# Altium footprint library texas.PCBLIB: 124 footprints (part 1 of 12)
Each footprint in its own frame and in the unit in brackets; x right, y up, seen from the top. Pads: shape width x height; smd on the part's side, far side on the other; paste and mask are expansions set on the pad; w line width, h text height; cw(c..) or ccw(c..) is an arc to the next point about the centre after c.
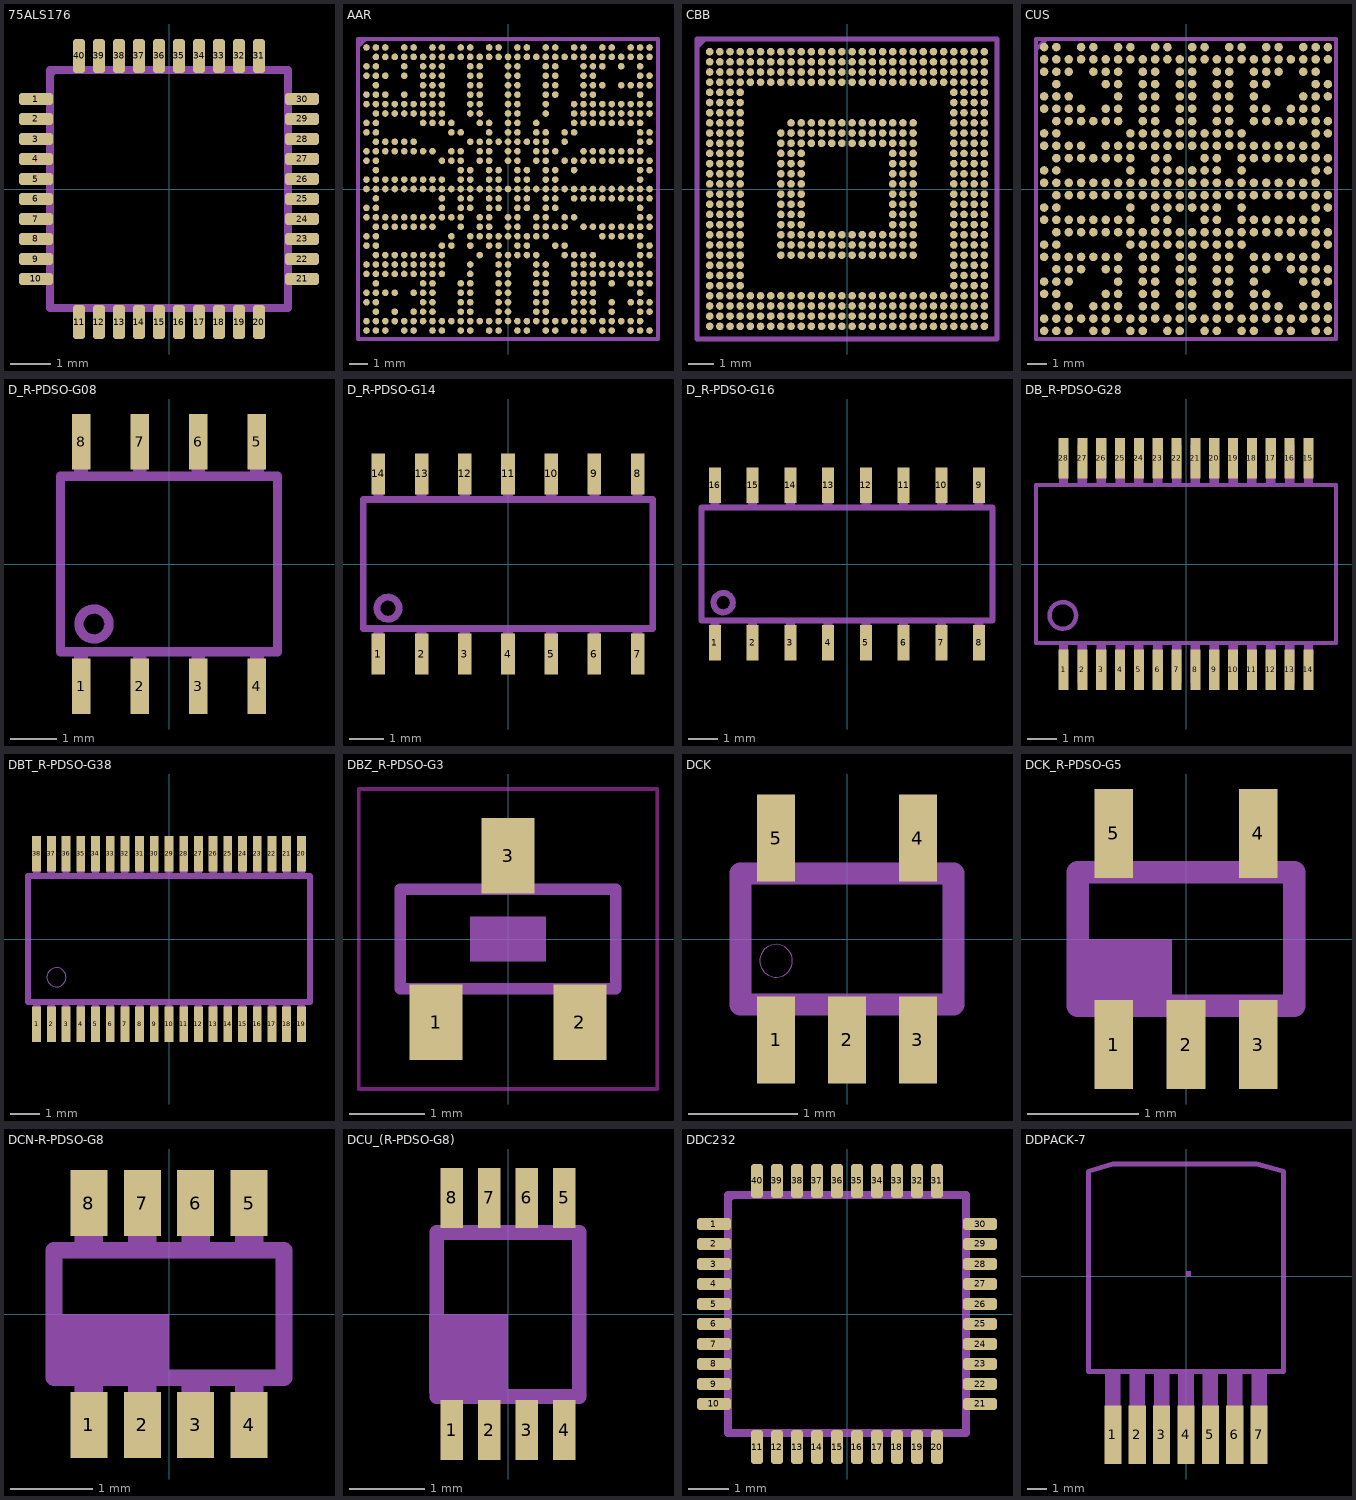
[diagram p0: the footprints below, top view; thin cyan lines are the x and y axes]

## 75ALS176 [mm]
pads (40):
  rrect50% 0.85x0.3 smd: 1(-3.325,2.25) 2(-3.325,1.75) 3(-3.325,1.25) 4(-3.325,0.75) 5(-3.325,0.25) 6(-3.325,-0.25) 7(-3.325,-0.75) 8(-3.325,-1.25) 9(-3.325,-1.75) 10(-3.325,-2.25) 21(3.325,-2.25) 22(3.325,-1.75) 23(3.325,-1.25) 24(3.325,-0.75) 25(3.325,-0.25) 26(3.325,0.25) 27(3.325,0.75) 28(3.325,1.25) 29(3.325,1.75) 30(3.325,2.25)
  rrect50% 0.3x0.85 smd: 11(-2.25,-3.325) 12(-1.75,-3.325) 13(-1.25,-3.325) 14(-0.75,-3.325) 15(-0.25,-3.325) 16(0.25,-3.325) 17(0.75,-3.325) 18(1.25,-3.325) 19(1.75,-3.325) 20(2.25,-3.325) 31(2.25,3.325) 32(1.75,3.325) 33(1.25,3.325) 34(0.75,3.325) 35(0.25,3.325) 36(-0.25,3.325) 37(-0.75,3.325) 38(-1.25,3.325) 39(-1.75,3.325) 40(-2.25,3.325)
Mechanical 2:
  lines w0.203: -2.973,2.875 -2.875,2.973 ; -2.973,-2.973 2.973,-2.973 2.973,2.973 -2.973,2.973 -2.973,-2.973
Mechanical 18:
  rectangle: -3.4,2.135 -3.075,2.365
  rectangle: -3.4,1.635 -3.075,1.865
  rectangle: -3.4,1.135 -3.075,1.365
  rectangle: -3.4,0.635 -3.075,0.865
  rectangle: -3.4,0.135 -3.075,0.365
  rectangle: -3.4,-0.365 -3.075,-0.135
  rectangle: -3.4,-0.865 -3.075,-0.635
  rectangle: -3.4,-1.365 -3.075,-1.135
  rectangle: -3.4,-1.865 -3.075,-1.635
  rectangle: -3.4,-2.365 -3.075,-2.135
  rectangle: -2.365,-3.4 -2.135,-3.075
  rectangle: -1.865,-3.4 -1.635,-3.075
  rectangle: -1.365,-3.4 -1.135,-3.075
  rectangle: -0.865,-3.4 -0.635,-3.075
  rectangle: -0.365,-3.4 -0.135,-3.075
  rectangle: 0.135,-3.4 0.365,-3.075
  rectangle: 0.635,-3.4 0.865,-3.075
  rectangle: 1.135,-3.4 1.365,-3.075
  rectangle: 1.635,-3.4 1.865,-3.075
  rectangle: 2.135,-3.4 2.365,-3.075
  rectangle: 3.075,-2.365 3.4,-2.135
  rectangle: 3.075,-1.865 3.4,-1.635
  rectangle: 3.075,-1.365 3.4,-1.135
  rectangle: 3.075,-0.865 3.4,-0.635
  rectangle: 3.075,-0.365 3.4,-0.135
  rectangle: 3.075,0.135 3.4,0.365
  rectangle: 3.075,0.635 3.4,0.865
  rectangle: 3.075,1.135 3.4,1.365
  rectangle: 3.075,1.635 3.4,1.865
  rectangle: 3.075,2.135 3.4,2.365
  rectangle: 2.135,3.075 2.365,3.4
  rectangle: 1.635,3.075 1.865,3.4
  rectangle: 1.135,3.075 1.365,3.4
  rectangle: 0.635,3.075 0.865,3.4
  rectangle: 0.135,3.075 0.365,3.4
  rectangle: -0.365,3.075 -0.135,3.4
  rectangle: -0.865,3.075 -0.635,3.4
  rectangle: -1.365,3.075 -1.135,3.4
  rectangle: -1.865,3.075 -1.635,3.4
  rectangle: -2.365,3.075 -2.135,3.4

## AAR [mm]
pads (609):
  rrect100% 0.35x0.35 smd mask-0.175: A1(-7.5,7.5) A2(-7,7.5) A3(-6.5,7.5) A5(-5.5,7.5) A6(-5,7.5) A8(-4,7.5) A9(-3.5,7.5) A11(-2.5,7.5) A12(-2,7.5) A14(-1,7.5) A15(-0.5,7.5) A17(0.5,7.5) A18(1,7.5) A20(2,7.5) A21(2.5,7.5) A23(3.5,7.5) A24(4,7.5) A26(5,7.5) A27(5.5,7.5) A29(6.5,7.5) A30(7,7.5) A31(7.5,7.5) AA1(-7.5,-2.5) AA2(-7,-2.5) AA10(-3,-2.5) AA12(-2,-2.5) AA13(-1.5,-2.5) AA14(-1,-2.5) AA15(-0.5,-2.5) AA16(0,-2.5) AA17(0.5,-2.5) AA18(1,-2.5) AA19(1.5,-2.5) AA20(2,-2.5) AA26(5,-2.5) AA27(5.5,-2.5) AA28(6,-2.5) AA29(6.5,-2.5) AA30(7,-2.5) AB1(-7.5,-3) AB2(-7,-3) AB9(-3.5,-3) AB10(-3,-3) AB12(-2,-3) AB14(-1,-3) AB15(-0.5,-3) AB17(0.5,-3) AB18(1,-3) AB21(2.5,-3) AB22(3,-3) AB30(7,-3) AB31(7.5,-3) AC2(-7,-3.5) AC3(-6.5,-3.5) AC4(-6,-3.5) AC5(-5.5,-3.5) AC6(-5,-3.5) AC7(-4.5,-3.5) AC8(-4,-3.5) AC9(-3.5,-3.5) AC13(-1.5,-3.5) AC15(-0.5,-3.5) AC16(0,-3.5) AC17(0.5,-3.5) AC18(1,-3.5) AC19(1.5,-3.5) AC22(3,-3.5) AC23(3.5,-3.5) AC24(4,-3.5) AC25(4.5,-3.5) AC30(7,-3.5) AC31(7.5,-3.5) AD1(-7.5,-4) AD2(-7,-4) AD3(-6.5,-4) AD4(-6,-4) AD5(-5.5,-4) AD6(-5,-4) AD7(-4.5,-4) AD8(-4,-4) AD9(-3.5,-4) AD12(-2,-4) AD15(-0.5,-4) AD16(0,-4) AD19(1.5,-4) AD20(2,-4) AD23(3.5,-4) AD24(4,-4) AD25(4.5,-4) AD26(5,-4) AD27(5.5,-4) AD28(6,-4) AD29(6.5,-4) AD30(7,-4) AE1(-7.5,-4.5) AE2(-7,-4.5) AE3(-6.5,-4.5) AE4(-6,-4.5) AE5(-5.5,-4.5) AE6(-5,-4.5) AE7(-4.5,-4.5) AE8(-4,-4.5) AE9(-3.5,-4.5) AE12(-2,-4.5) AE15(-0.5,-4.5) AE16(0,-4.5) AE19(1.5,-4.5) AE20(2,-4.5) AE23(3.5,-4.5) AE24(4,-4.5) AE25(4.5,-4.5) AE26(5,-4.5) AE27(5.5,-4.5) AE28(6,-4.5) AE29(6.5,-4.5) AE30(7,-4.5) AE31(7.5,-4.5) AF2(-7,-5) AF7(-4.5,-5) AF8(-4,-5) AF11(-2.5,-5) AF12(-2,-5) AF15(-0.5,-5) AF16(0,-5) AF19(1.5,-5) AF20(2,-5) AF23(3.5,-5) AF24(4,-5) AF25(4.5,-5) AF27(5.5,-5) AF29(6.5,-5) AF30(7,-5) AF31(7.5,-5) AG1(-7.5,-5.5) AG2(-7,-5.5) AG3(-6.5,-5.5) AG4(-6,-5.5) AG6(-5,-5.5) AG7(-4.5,-5.5) AG8(-4,-5.5) AG11(-2.5,-5.5) AG12(-2,-5.5) AG15(-0.5,-5.5) AG16(0,-5.5) AG19(1.5,-5.5) AG20(2,-5.5) AG23(3.5,-5.5) AG24(4,-5.5) AG25(4.5,-5.5) AG30(7,-5.5) AH1(-7.5,-6) AH2(-7,-6) AH7(-4.5,-6) AH8(-4,-6) AH11(-2.5,-6) AH12(-2,-6) AH15(-0.5,-6) AH16(0,-6) AH19(1.5,-6) AH20(2,-6) AH23(3.5,-6) AH24(4,-6) AH25(4.5,-6) AH27(5.5,-6) AH29(6.5,-6) AH30(7,-6) AH31(7.5,-6) AJ2(-7,-6.5) AJ4(-6,-6.5) AJ6(-5,-6.5) AJ7(-4.5,-6.5) AJ8(-4,-6.5) AJ11(-2.5,-6.5) AJ12(-2,-6.5) AJ15(-0.5,-6.5) AJ16(0,-6.5) AJ19(1.5,-6.5) AJ20(2,-6.5) AJ23(3.5,-6.5) AJ24(4,-6.5) AJ25(4.5,-6.5) AJ27(5.5,-6.5) AJ30(7,-6.5) AJ31(7.5,-6.5) AK1(-7.5,-7) AK2(-7,-7) AK3(-6.5,-7) AK4(-6,-7) AK5(-5.5,-7) AK6(-5,-7) AK7(-4.5,-7) AK8(-4,-7) AK9(-3.5,-7) AK10(-3,-7) AK11(-2.5,-7) AK12(-2,-7) AK13(-1.5,-7) AK14(-1,-7) AK15(-0.5,-7) AK16(0,-7) AK17(0.5,-7) AK18(1,-7) AK19(1.5,-7) AK20(2,-7) AK21(2.5,-7) AK22(3,-7) AK23(3.5,-7) AK24(4,-7) AK25(4.5,-7) AK26(5,-7) AK27(5.5,-7) AK28(6,-7) AK29(6.5,-7) AK30(7,-7) AL1(-7.5,-7.5) AL2(-7,-7.5) AL3(-6.5,-7.5) AL5(-5.5,-7.5) AL6(-5,-7.5) AL8(-4,-7.5) AL9(-3.5,-7.5) AL11(-2.5,-7.5) AL12(-2,-7.5) AL14(-1,-7.5) AL15(-0.5,-7.5) AL17(0.5,-7.5) AL18(1,-7.5) AL20(2,-7.5) AL21(2.5,-7.5) AL23(3.5,-7.5) AL24(4,-7.5) AL26(5,-7.5) AL27(5.5,-7.5) AL29(6.5,-7.5) AL30(7,-7.5) AL31(7.5,-7.5) B2(-7,7) B3(-6.5,7) B4(-6,7) B5(-5.5,7) B6(-5,7) B7(-4.5,7) B8(-4,7) B9(-3.5,7) B10(-3,7) B11(-2.5,7) B12(-2,7) B13(-1.5,7) B14(-1,7) B15(-0.5,7) B16(0,7) B17(0.5,7) B18(1,7) B19(1.5,7) B20(2,7) B21(2.5,7) B22(3,7) B23(3.5,7) B24(4,7) B25(4.5,7) B26(5,7) B27(5.5,7) B28(6,7) B29(6.5,7) B30(7,7) B31(7.5,7) C1(-7.5,6.5) C2(-7,6.5) C5(-5.5,6.5) C7(-4.5,6.5) C8(-4,6.5) C9(-3.5,6.5) C12(-2,6.5) C13(-1.5,6.5) C16(0,6.5) C17(0.5,6.5) C20(2,6.5) C23(2.5,6.5) C24(4,6.5) C25(4.5,6.5) C26(5,6.5) C28(6,6.5) C30(7,6.5) D1(-7.5,6) D2(-7,6) D3(-6.5,6) D5(-5.5,6) D7(-4.5,6) D8(-4,6) D9(-3.5,6) D12(-2,6) D13(-1.5,6) D16(0,6) D17(0.5,6) D20(2,6) D21(2.5,6) D24(4,6) D25(4.5,6) D30(7,6) D31(7.5,6) E2(-7,5.5) E7(-4.5,5.5) E8(-4,5.5) E9(-3.5,5.5) E12(-2,5.5) E13(-1.5,5.5) E16(0,5.5) E17(0.5,5.5) E20(2,5.5) E21(2.5,5.5) E24(4,5.5) E25(4.5,5.5) E26(5,5.5) E28(6,5.5) E29(6.5,5.5) E30(7,5.5) E31(7.5,5.5) F1(-7.5,5) F2(-7,5) F3(-6.5,5) F5(-5.5,5) F7(-4.5,5) F8(-4,5) F9(-3.5,5) F12(-2,5) F13(-1.5,5) F16(0,5) F17(0.5,5) F20(2,5) F21(2.5,5) F24(4,5) F25(4.5,5) F30(7,5) G1(-7.5,4.5) G2(-7,4.5) G3(-6.5,4.5) G4(-6,4.5) G5(-5.5,4.5) G6(-5,4.5) G7(-4.5,4.5) G8(-4,4.5) G9(-3.5,4.5) G12(-2,4.5) G13(-1.5,4.5) G16(0,4.5) G17(0.5,4.5) G20(2,4.5) G23(3.5,4.5) G24(4,4.5) G25(4.5,4.5) G26(5,4.5) G27(5.5,4.5) G28(6,4.5) G29(6.5,4.5) G30(7,4.5) G31(7.5,4.5) H2(-7,4) H3(-6.5,4) H4(-6,4) H5(-5.5,4) H6(-5,4) H7(-4.5,4) H8(-4,4) H9(-3.5,4) H12(-2,4) H13(-1.5,4) H16(0,4) H17(0.5,4) H20(2,4) H23(3.5,4) H24(4,4) H25(4.5,4) H26(5,4) H27(5.5,4) H28(6,4) H29(6.5,4) H30(7,4) H31(7.5,4) J1(-7.5,3.5) J2(-7,3.5) J7(-4.5,3.5) J8(-4,3.5) J9(-3.5,3.5) J10(-3,3.5) J13(-1.5,3.5) J14(-1,3.5) J16(0,3.5) J17(0.5,3.5) J19(1.5,3.5) J23(3.5,3.5) J24(4,3.5) J25(4.5,3.5) J26(5,3.5) J27(5.5,3.5) J28(6,3.5) J29(6.5,3.5) J30(7,3.5) K1(-7.5,3) K2(-7,3) K10(-3,3) K11(-2.5,3) K14(-1,3) K16(0,3) K17(0.5,3) K19(1.5,3) K20(2,3) K22(3,3) K23(3.5,3) K30(7,3) K31(7.5,3) L2(-7,2.5) L3(-6.5,2.5) L4(-6,2.5) L5(-5.5,2.5) L6(-5,2.5) L12(-2,2.5) L13(-1.5,2.5) L14(-1,2.5) L15(-0.5,2.5) L16(0,2.5) L17(0.5,2.5) L18(1,2.5) L19(1.5,2.5) L20(2,2.5) L22(3,2.5) L30(7,2.5) L31(7.5,2.5) M1(-7.5,2) M2(-7,2) M3(-6.5,2) M4(-6,2) M5(-5.5,2) M6(-5,2) M7(-4.5,2) M8(-4,2) M10(-3,2) M11(-2.5,2) M13(-1.5,2) M14(-1,2) M16(0,2) M17(0.5,2) M19(1.5,2) M20(2,2) M21(2.5,2) M24(4,2) M25(4.5,2) M26(5,2) M27(5.5,2) M28(6,2) M29(6.5,2) M30(7,2) N1(-7.5,1.5) N2(-7,1.5) N9(-3.5,1.5) N10(-3,1.5) N11(-2.5,1.5) N13(-1.5,1.5) N14(-1,1.5) N16(0,1.5) N17(0.5,1.5) N19(1.5,1.5) N20(2,1.5) N22(3,1.5) N23(3.5,1.5) N24(4,1.5) N25(4.5,1.5) N26(5,1.5) N27(5.5,1.5) N28(6,1.5) N29(6.5,1.5) N30(7,1.5) N31(7.5,1.5) P2(-7,1) P11(-2.5,1) P12(-2,1) P14(-1,1) P15(-0.5,1) P17(0.5,1) P18(1,1) P20(2,1) P21(2.5,1) P23(3.5,1) P30(7,1) P31(7.5,1) R1(-7.5,0.5) R2(-7,0.5) R3(-6.5,0.5) R4(-6,0.5) R5(-5.5,0.5) R6(-5,0.5) R7(-4.5,0.5) R8(-4,0.5) R9(-3.5,0.5) R11(-2.5,0.5) R12(-2,0.5) R14(-1,0.5) R15(-0.5,0.5) R17(0.5,0.5) R18(1,0.5) R20(2,0.5) R21(2.5,0.5) R30(7,0.5) T1(-7.5,0) T2(-7,0) T3(-6.5,0) T4(-6,0) T5(-5.5,0) T6(-5,0) T7(-4.5,0) T8(-4,0) T9(-3.5,0) T10(-3,0) T11(-2.5,0) T12(-2,0) T13(-1.5,0) T14(-1,0) T15(-0.5,0) T16(0,0) T17(0.5,0) T18(1,0) T19(1.5,0) T20(2,0) T21(2.5,0) T22(3,0) T23(3.5,0) T24(4,0) T25(4.5,0) T26(5,0) T27(5.5,0) T28(6,0) T29(6.5,0) T30(7,0) T31(7.5,0) U2(-7,-0.5) U9(-3.5,-0.5) U11(-2.5,-0.5) U12(-2,-0.5) U14(-1,-0.5) U15(-0.5,-0.5) U17(0.5,-0.5) U18(1,-0.5) U20(2,-0.5) U21(2.5,-0.5) U23(3.5,-0.5) U24(4,-0.5) U25(4.5,-0.5) U26(5,-0.5) U27(5.5,-0.5) U28(6,-0.5) U29(6.5,-0.5) U30(7,-0.5) U31(7.5,-0.5) V1(-7.5,-1) V2(-7,-1) V9(-3.5,-1) V11(-2.5,-1) V12(-2,-1) V14(-1,-1) V15(-0.5,-1) V17(0.5,-1) V18(1,-1) V20(2,-1) V21(2.5,-1) V30(7,-1) W1(-7.5,-1.5) W2(-7,-1.5) W3(-6.5,-1.5) W4(-6,-1.5) W5(-5.5,-1.5) W6(-5,-1.5) W7(-4.5,-1.5) W8(-4,-1.5) W9(-3.5,-1.5) W10(-3,-1.5) W11(-2.5,-1.5) W13(-1.5,-1.5) W14(-1,-1.5) W16(0,-1.5) W17(0.5,-1.5) W19(1.5,-1.5) W20(2,-1.5) W22(3,-1.5) W23(3.5,-1.5) W30(7,-1.5) W31(7.5,-1.5) Y2(-7,-2) Y3(-6.5,-2) Y4(-6,-2) Y5(-5.5,-2) Y6(-5,-2) Y7(-4.5,-2) Y8(-4,-2) Y11(-2.5,-2) Y13(-1.5,-2) Y14(-1,-2) Y16(0,-2) Y17(0.5,-2) Y19(1.5,-2) Y20(2,-2) Y21(2.5,-2) Y22(3,-2) Y24(4,-2) Y25(4.5,-2) Y26(5,-2) Y27(5.5,-2) Y28(6,-2) Y29(6.5,-2) Y30(7,-2) Y31(7.5,-2)
Top Solder:
  drawing of 609 lines, arcs and shapes, not listed
Mechanical 2:
  lines w0.203: -7.948,7.55 -7.948,7.948 -7.55,7.948 ; -7.948,7.55 -7.948,-7.948 7.948,-7.948 7.948,7.948 -7.55,7.948 ; -7.948,7.55 -7.55,7.948

## CBB [mm]
pads (515):
  rrect100% 0.3x0.3 smd mask-0.15: A1(-5.4,5.4) A2(-5,5.4) A3(-4.6,5.4) A4(-4.2,5.4) A5(-3.8,5.4) A6(-3.4,5.4) A7(-3,5.4) A8(-2.6,5.4) A9(-2.2,5.4) A10(-1.8,5.4) A11(-1.4,5.4) A12(-1,5.4) A13(-0.6,5.4) A14(-0.2,5.4) A15(0.2,5.4) A16(0.6,5.4) A17(1,5.4) A18(1.4,5.4) A19(1.8,5.4) A20(2.2,5.4) A21(2.6,5.4) A22(3,5.4) A23(3.4,5.4) A24(3.8,5.4) A25(4.2,5.4) A26(4.6,5.4) A27(5,5.4) A28(5.4,5.4) AA1(-5.4,-2.6) AA2(-5,-2.6) AA3(-4.6,-2.6) AA4(-4.2,-2.6) AA8(-2.6,-2.6) AA9(-2.2,-2.6) AA10(-1.8,-2.6) AA11(-1.4,-2.6) AA12(-1,-2.6) AA13(-0.6,-2.6) AA14(-0.2,-2.6) AA15(0.2,-2.6) AA16(0.6,-2.6) AA17(1,-2.6) AA18(1.4,-2.6) AA19(1.8,-2.6) AA20(2.2,-2.6) AA21(2.6,-2.6) AA25(4.2,-2.6) AA26(4.6,-2.6) AA27(5,-2.6) AA28(5.4,-2.6) AB1(-5.4,-3) AB2(-5,-3) AB3(-4.6,-3) AB4(-4.2,-3) AB25(4.2,-3) AB26(4.6,-3) AB27(5,-3) AB28(5.4,-3) AC1(-5.4,-3.4) AC2(-5,-3.4) AC3(-4.6,-3.4) AC4(-4.2,-3.4) AC25(4.2,-3.4) AC26(4.6,-3.4) AC27(5,-3.4) AC28(5.4,-3.4) AD1(-5.4,-3.8) AD2(-5,-3.8) AD3(-4.6,-3.8) AD4(-4.2,-3.8) AD25(4.2,-3.8) AD26(4.6,-3.8) AD27(5,-3.8) AD28(5.4,-3.8) AE1(-5.4,-4.2) AE2(-5,-4.2) AE3(-4.6,-4.2) AE4(-4.2,-4.2) AE5(-3.8,-4.2) AE6(-3.4,-4.2) AE7(-3,-4.2) AE8(-2.6,-4.2) AE9(-2.2,-4.2) AE10(-1.8,-4.2) AE11(-1.4,-4.2) AE12(-1,-4.2) AE13(-0.6,-4.2) AE14(-0.2,-4.2) AE15(0.2,-4.2) AE16(0.6,-4.2) AE17(1,-4.2) AE18(1.4,-4.2) AE19(1.8,-4.2) AE20(2.2,-4.2) AE21(2.6,-4.2) AE22(3,-4.2) AE23(3.4,-4.2) AE24(3.8,-4.2) AE25(4.2,-4.2) AE26(4.6,-4.2) AE27(5,-4.2) AE28(5.4,-4.2) AF1(-5.4,-4.6) AF2(-5,-4.6) AF3(-4.6,-4.6) AF4(-4.2,-4.6) AF5(-3.8,-4.6) AF6(-3.4,-4.6) AF7(-3,-4.6) AF8(-2.6,-4.6) AF9(-2.2,-4.6) AF10(-1.8,-4.6) AF11(-1.4,-4.6) AF12(-1,-4.6) AF13(-0.6,-4.6) AF14(-0.2,-4.6) AF15(0.2,-4.6) AF16(0.6,-4.6) AF17(1,-4.6) AF18(1.4,-4.6) AF19(1.8,-4.6) AF20(2.2,-4.6) AF21(2.6,-4.6) AF22(3,-4.6) AF23(3.4,-4.6) AF24(3.8,-4.6) AF25(4.2,-4.6) AF26(4.6,-4.6) AF27(5,-4.6) AF28(5.4,-4.6) AG1(-5.4,-5) AG2(-5,-5) AG3(-4.6,-5) AG4(-4.2,-5) AG5(-3.8,-5) AG6(-3.4,-5) AG7(-3,-5) AG8(-2.6,-5) AG9(-2.2,-5) AG10(-1.8,-5) AG11(-1.4,-5) AG12(-1,-5) AG13(-0.6,-5) AG14(-0.2,-5) AG15(0.2,-5) AG16(0.6,-5) AG17(1,-5) AG18(1.4,-5) AG19(1.8,-5) AG20(2.2,-5) AG21(2.6,-5) AG22(3,-5) AG23(3.4,-5) AG24(3.8,-5) AG25(4.2,-5) AG26(4.6,-5) AG27(5,-5) AG28(5.4,-5) AH1(-5.4,-5.4) AH2(-5,-5.4) AH3(-4.6,-5.4) AH4(-4.2,-5.4) AH5(-3.8,-5.4) AH6(-3.4,-5.4) AH7(-3,-5.4) AH8(-2.6,-5.4) AH9(-2.2,-5.4) AH10(-1.8,-5.4) AH11(-1.4,-5.4) AH12(-1,-5.4) AH13(-0.6,-5.4) AH14(-0.2,-5.4) AH15(0.2,-5.4) AH16(0.6,-5.4) AH17(1,-5.4) AH18(1.4,-5.4) AH19(1.8,-5.4) AH20(2.2,-5.4) AH21(2.6,-5.4) AH22(3,-5.4) AH23(3.4,-5.4) AH24(3.8,-5.4) AH25(4.2,-5.4) AH26(4.6,-5.4) AH27(5,-5.4) AH28(5.4,-5.4) B1(-5.4,5) B2(-5,5) B3(-4.6,5) B4(-4.2,5) B5(-3.8,5) B6(-3.4,5) B7(-3,5) B8(-2.6,5) B9(-2.2,5) B10(-1.8,5) B11(-1.4,5) B12(-1,5) B13(-0.6,5) B14(-0.2,5) B15(0.2,5) B16(0.6,5) B17(1,5) B18(1.4,5) B19(1.8,5) B20(2.2,5) B21(2.6,5) B22(3,5) B23(3.4,5) B24(3.8,5) B25(4.2,5) B26(4.6,5) B27(5,5) B28(5.4,5) C1(-5.4,4.6) C2(-5,4.6) C3(-4.6,4.6) C4(-4.2,4.6) C5(-3.8,4.6) C6(-3.4,4.6) C7(-3,4.6) C8(-2.6,4.6) C9(-2.2,4.6) C10(-1.8,4.6) C11(-1.4,4.6) C12(-1,4.6) C13(-0.6,4.6) C14(-0.2,4.6) C15(0.2,4.6) C16(0.6,4.6) C17(1,4.6) C18(1.4,4.6) C19(1.8,4.6) C20(2.2,4.6) C21(2.6,4.6) C22(3,4.6) C23(3.4,4.6) C24(3.8,4.6) C25(4.2,4.6) C26(4.6,4.6) C27(5,4.6) C28(5.4,4.6) D1(-5.4,4.2) D2(-5,4.2) D3(-4.6,4.2) D4(-4.2,4.2) D5(-3.8,4.2) D6(-3.4,4.2) D7(-3,4.2) D8(-2.6,4.2) D9(-2.2,4.2) D10(-1.8,4.2) D11(-1.4,4.2) D12(-1,4.2) D13(-0.6,4.2) D14(-0.2,4.2) D15(0.2,4.2) D16(0.6,4.2) D17(1,4.2) D18(1.4,4.2) D19(1.8,4.2) D20(2.2,4.2) D21(2.6,4.2) D22(3,4.2) D23(3.4,4.2) D24(3.8,4.2) D25(4.2,4.2) D26(4.6,4.2) D27(5,4.2) D28(5.4,4.2) E1(-5.4,3.8) E2(-5,3.8) E3(-4.6,3.8) E4(-4.2,3.8) E25(4.2,3.8) E26(4.6,3.8) E27(5,3.8) E28(5.4,3.8) F1(-5.4,3.4) F2(-5,3.4) F3(-4.6,3.4) F4(-4.2,3.4) F25(4.2,3.4) F26(4.6,3.4) F27(5,3.4) F28(5.4,3.4) G1(-5.4,3) G2(-5,3) G3(-4.6,3) G4(-4.2,3) G25(4.2,3) G26(4.6,3) G27(5,3) G28(5.4,3) H1(-5.4,2.6) H2(-5,2.6) H3(-4.6,2.6) H4(-4.2,2.6) H9(-2.2,2.6) H10(-1.8,2.6) H11(-1.4,2.6) H12(-1,2.6) H13(-0.6,2.6) H14(-0.2,2.6) H15(0.2,2.6) H16(0.6,2.6) H17(1,2.6) H18(1.4,2.6) H19(1.8,2.6) H20(2.2,2.6) H21(2.6,2.6) H25(4.2,2.6) H26(4.6,2.6) H27(5,2.6) H28(5.4,2.6) J1(-5.4,2.2) J2(-5,2.2) J3(-4.6,2.2) J4(-4.2,2.2) J8(-2.6,2.2) J9(-2.2,2.2) J10(-1.8,2.2) J11(-1.4,2.2) J12(-1,2.2) J13(-0.6,2.2) J14(-0.2,2.2) J15(0.2,2.2) J16(0.6,2.2) J17(1,2.2) J18(1.4,2.2) J19(1.8,2.2) J20(2.2,2.2) J21(2.6,2.2) J25(4.2,2.2) J26(4.6,2.2) J27(5,2.2) J28(5.4,2.2) K1(-5.4,1.8) K2(-5,1.8) K3(-4.6,1.8) K4(-4.2,1.8) K8(-2.6,1.8) K9(-2.2,1.8) K10(-1.8,1.8) K11(-1.4,1.8) K12(-1,1.8) K13(-0.6,1.8) K14(-0.2,1.8) K15(0.2,1.8) K16(0.6,1.8) K17(1,1.8) K18(1.4,1.8) K19(1.8,1.8) K20(2.2,1.8) K21(2.6,1.8) K25(4.2,1.8) K26(4.6,1.8) K27(5,1.8) K28(5.4,1.8) L1(-5.4,1.4) L2(-5,1.4) L3(-4.6,1.4) L4(-4.2,1.4) L8(-2.6,1.4) L9(-2.2,1.4) L10(-1.8,1.4) L19(1.8,1.4) L20(2.2,1.4) L21(2.6,1.4) L25(4.2,1.4) L26(4.6,1.4) L27(5,1.4) L28(5.4,1.4) M1(-5.4,1) M2(-5,1) M3(-4.6,1) M4(-4.2,1) M8(-2.6,1) M9(-2.2,1) M10(-1.8,1) M19(1.8,1) M20(2.2,1) M21(2.6,1) M25(4.2,1) M26(4.6,1) M27(5,1) M28(5.4,1) N1(-5.4,0.6) N2(-5,0.6) N3(-4.6,0.6) N4(-4.2,0.6) N8(-2.6,0.6) N9(-2.2,0.6) N10(-1.8,0.6) N19(1.8,0.6) N20(2.2,0.6) N21(2.6,0.6) N25(4.2,0.6) N26(4.6,0.6) N27(5,0.6) N28(5.4,0.6) P1(-5.4,0.2) P2(-5,0.2) P3(-4.6,0.2) P4(-4.2,0.2) P8(-2.6,0.2) P9(-2.2,0.2) P10(-1.8,0.2) P19(1.8,0.2) P20(2.2,0.2) P21(2.6,0.2) P25(4.2,0.2) P26(4.6,0.2) P27(5,0.2) P28(5.4,0.2) R1(-5.4,-0.2) R2(-5,-0.2) R3(-4.6,-0.2) R4(-4.2,-0.2) R8(-2.6,-0.2) R9(-2.2,-0.2) R10(-1.8,-0.2) R19(1.8,-0.2) R20(2.2,-0.2) R21(2.6,-0.2) R25(4.2,-0.2) R26(4.6,-0.2) R27(5,-0.2) R28(5.4,-0.2) T1(-5.4,-0.6) T2(-5,-0.6) T3(-4.6,-0.6) T4(-4.2,-0.6) T8(-2.6,-0.6) T9(-2.2,-0.6) T10(-1.8,-0.6) T19(1.8,-0.6) T20(2.2,-0.6) T21(2.6,-0.6) T25(4.2,-0.6) T26(4.6,-0.6) T27(5,-0.6) T28(5.4,-0.6) U1(-5.4,-1) U2(-5,-1) U3(-4.6,-1) U4(-4.2,-1) U8(-2.6,-1) U9(-2.2,-1) U10(-1.8,-1) U19(1.8,-1) U20(2.2,-1) U21(2.6,-1) U25(4.2,-1) U26(4.6,-1) U27(5,-1) U28(5.4,-1) V1(-5.4,-1.4) V2(-5,-1.4) V3(-4.6,-1.4) V4(-4.2,-1.4) V8(-2.6,-1.4) V9(-2.2,-1.4) V10(-1.8,-1.4) V19(1.8,-1.4) V20(2.2,-1.4) V21(2.6,-1.4) V25(4.2,-1.4) V26(4.6,-1.4) V27(5,-1.4) V28(5.4,-1.4) W1(-5.4,-1.8) W2(-5,-1.8) W3(-4.6,-1.8) W4(-4.2,-1.8) W8(-2.6,-1.8) W9(-2.2,-1.8) W10(-1.8,-1.8) W11(-1.4,-1.8) W12(-1,-1.8) W13(-0.6,-1.8) W14(-0.2,-1.8) W15(0.2,-1.8) W16(0.6,-1.8) W17(1,-1.8) W18(1.4,-1.8) W19(1.8,-1.8) W20(2.2,-1.8) W21(2.6,-1.8) W25(4.2,-1.8) W26(4.6,-1.8) W27(5,-1.8) W28(5.4,-1.8) Y1(-5.4,-2.2) Y2(-5,-2.2) Y3(-4.6,-2.2) Y4(-4.2,-2.2) Y8(-2.6,-2.2) Y9(-2.2,-2.2) Y10(-1.8,-2.2) Y11(-1.4,-2.2) Y12(-1,-2.2) Y13(-0.6,-2.2) Y14(-0.2,-2.2) Y15(0.2,-2.2) Y16(0.6,-2.2) Y17(1,-2.2) Y18(1.4,-2.2) Y19(1.8,-2.2) Y20(2.2,-2.2) Y21(2.6,-2.2) Y25(4.2,-2.2) Y26(4.6,-2.2) Y27(5,-2.2) Y28(5.4,-2.2)
Top Solder:
  drawing of 515 lines, arcs and shapes, not listed
Mechanical 2:
  lines w0.203: -5.898,5.6 -5.898,5.898 -5.6,5.898 ; -5.898,5.6 -5.898,-5.898 5.898,-5.898 5.898,5.898 -5.6,5.898 ; -5.898,5.6 -5.6,5.898

## CUS [mm]
pads (423):
  rrect100% 0.45x0.45 smd mask-0.225: A1(-7.475,7.475) A2(-6.825,7.475) A4(-5.525,7.475) A5(-4.875,7.475) A7(-3.575,7.475) A8(-2.925,7.475) A10(-1.625,7.475) A11(-0.975,7.475) A13(0.325,7.475) A14(0.975,7.475) A16(2.275,7.475) A17(2.925,7.475) A19(4.225,7.475) A20(4.875,7.475) A22(6.175,7.475) A23(6.825,7.475) A24(7.475,7.475) AA1(-7.475,-5.525) AA2(-6.825,-5.525) AA6(-4.225,-5.525) AA7(-3.575,-5.525) AA9(-2.275,-5.525) AA10(-1.625,-5.525) AA12(-0.325,-5.525) AA13(0.325,-5.525) AA15(1.625,-5.525) AA16(2.275,-5.525) AA18(3.575,-5.525) AA19(4.225,-5.525) AA23(6.825,-5.525) AB2(-6.825,-6.175) AB3(-6.175,-6.175) AB5(-4.875,-6.175) AB6(-4.225,-6.175) AB7(-3.575,-6.175) AB9(-2.275,-6.175) AB10(-1.625,-6.175) AB12(-0.325,-6.175) AB13(0.325,-6.175) AB15(1.625,-6.175) AB16(2.275,-6.175) AB18(3.575,-6.175) AB19(4.225,-6.175) AB20(4.875,-6.175) AB22(6.175,-6.175) AB23(6.825,-6.175) AB24(7.475,-6.175) AC1(-7.475,-6.825) AC2(-6.825,-6.825) AC3(-6.175,-6.825) AC4(-5.525,-6.825) AC5(-4.875,-6.825) AC6(-4.225,-6.825) AC7(-3.575,-6.825) AC8(-2.925,-6.825) AC9(-2.275,-6.825) AC10(-1.625,-6.825) AC11(-0.975,-6.825) AC12(-0.325,-6.825) AC13(0.325,-6.825) AC14(0.975,-6.825) AC15(1.625,-6.825) AC16(2.275,-6.825) AC17(2.925,-6.825) AC18(3.575,-6.825) AC19(4.225,-6.825) AC20(4.875,-6.825) AC21(5.525,-6.825) AC22(6.175,-6.825) AC23(6.825,-6.825) AC24(7.475,-6.825) AD1(-7.475,-7.475) AD2(-6.825,-7.475) AD3(-6.175,-7.475) AD5(-4.875,-7.475) AD6(-4.225,-7.475) AD8(-2.925,-7.475) AD9(-2.275,-7.475) AD11(-0.975,-7.475) AD12(-0.325,-7.475) AD14(0.975,-7.475) AD15(1.625,-7.475) AD17(2.925,-7.475) AD18(3.575,-7.475) AD20(4.875,-7.475) AD21(5.525,-7.475) AD23(6.825,-7.475) AD24(7.475,-7.475) B1(-7.475,6.825) B2(-6.825,6.825) B3(-6.175,6.825) B4(-5.525,6.825) B5(-4.875,6.825) B6(-4.225,6.825) B7(-3.575,6.825) B8(-2.925,6.825) B9(-2.275,6.825) B10(-1.625,6.825) B11(-0.975,6.825) B12(-0.325,6.825) B13(0.325,6.825) B14(0.975,6.825) B15(1.625,6.825) B16(2.275,6.825) B17(2.925,6.825) B18(3.575,6.825) B19(4.225,6.825) B20(4.875,6.825) B21(5.525,6.825) B22(6.175,6.825) B23(6.825,6.825) B24(7.475,6.825) C1(-7.475,6.175) C2(-6.825,6.175) C3(-6.175,6.175) C5(-4.875,6.175) C6(-4.225,6.175) C7(-3.575,6.175) C9(-2.275,6.175) C10(-1.625,6.175) C12(-0.325,6.175) C13(0.325,6.175) C15(1.625,6.175) C16(2.275,6.175) C18(3.575,6.175) C19(4.225,6.175) C20(4.875,6.175) C22(6.175,6.175) C23(6.825,6.175) D2(-6.825,5.525) D6(-4.225,5.525) D7(-3.575,5.525) D9(-2.275,5.525) D10(-1.625,5.525) D12(-0.325,5.525) D13(0.325,5.525) D15(1.625,5.525) D16(2.275,5.525) D18(3.575,5.525) D19(4.225,5.525) D23(6.825,5.525) D24(7.475,5.525) E1(-7.475,4.875) E2(-6.825,4.875) E3(-6.175,4.875) E7(-3.575,4.875) E9(-2.275,4.875) E10(-1.625,4.875) E12(-0.325,4.875) E13(0.325,4.875) E15(1.625,4.875) E16(2.275,4.875) E18(3.575,4.875) E22(6.175,4.875) E23(6.825,4.875) E24(7.475,4.875) F1(-7.475,4.225) F2(-6.825,4.225) F3(-6.175,4.225) F4(-5.525,4.225) F6(-4.225,4.225) F7(-3.575,4.225) F9(-2.275,4.225) F10(-1.625,4.225) F12(-0.325,4.225) F13(0.325,4.225) F15(1.625,4.225) F16(2.275,4.225) F18(3.575,4.225) F19(4.225,4.225) F21(5.525,4.225) F22(6.175,4.225) F23(6.825,4.225) G2(-6.825,3.575) G3(-6.175,3.575) G4(-5.525,3.575) G5(-4.875,3.575) G6(-4.225,3.575) G7(-3.575,3.575) G9(-2.275,3.575) G10(-1.625,3.575) G12(-0.325,3.575) G13(0.325,3.575) G15(1.625,3.575) G16(2.275,3.575) G18(3.575,3.575) G19(4.225,3.575) G20(4.875,3.575) G21(5.525,3.575) G22(6.175,3.575) G23(6.825,3.575) G24(7.475,3.575) H1(-7.475,2.925) H2(-6.825,2.925) H8(-2.925,2.925) H9(-2.275,2.925) H10(-1.625,2.925) H11(-0.975,2.925) H12(-0.325,2.925) H13(0.325,2.925) H14(0.975,2.925) H15(1.625,2.925) H16(2.275,2.925) H17(2.925,2.925) H23(6.825,2.925) H24(7.475,2.925) J1(-7.475,2.275) J2(-6.825,2.275) J3(-6.175,2.275) J4(-5.525,2.275) J6(-4.225,2.275) J7(-3.575,2.275) J8(-2.925,2.275) J9(-2.275,2.275) J10(-1.625,2.275) J11(-0.975,2.275) J12(-0.325,2.275) J13(0.325,2.275) J14(0.975,2.275) J15(1.625,2.275) J16(2.275,2.275) J17(2.925,2.275) J18(3.575,2.275) J19(4.225,2.275) J20(4.875,2.275) J21(5.525,2.275) J22(6.175,2.275) J23(6.825,2.275) K2(-6.825,1.625) K3(-6.175,1.625) K4(-5.525,1.625) K5(-4.875,1.625) K6(-4.225,1.625) K7(-3.575,1.625) K8(-2.925,1.625) K10(-1.625,1.625) K11(-0.975,1.625) K14(0.975,1.625) K15(1.625,1.625) K17(2.925,1.625) K18(3.575,1.625) K19(4.225,1.625) K20(4.875,1.625) K21(5.525,1.625) K22(6.175,1.625) K23(6.825,1.625) K24(7.475,1.625) L1(-7.475,0.975) L2(-6.825,0.975) L8(-2.925,0.975) L10(-1.625,0.975) L11(-0.975,0.975) L12(-0.325,0.975) L13(0.325,0.975) L14(0.975,0.975) L15(1.625,0.975) L17(2.925,0.975) L23(6.825,0.975) L24(7.475,0.975) M1(-7.475,0.325) M2(-6.825,0.325) M3(-6.175,0.325) M4(-5.525,0.325) M5(-4.875,0.325) M6(-4.225,0.325) M7(-3.575,0.325) M8(-2.925,0.325) M9(-2.275,0.325) M10(-1.625,0.325) M11(-0.975,0.325) M12(-0.325,0.325) M13(0.325,0.325) M14(0.975,0.325) M15(1.625,0.325) M16(2.275,0.325) M17(2.925,0.325) M18(3.575,0.325) M19(4.225,0.325) M20(4.875,0.325) M21(5.525,0.325) M22(6.175,0.325) M23(6.825,0.325) N2(-6.825,-0.325) N3(-6.175,-0.325) N4(-5.525,-0.325) N5(-4.875,-0.325) N6(-4.225,-0.325) N7(-3.575,-0.325) N8(-2.925,-0.325) N9(-2.275,-0.325) N10(-1.625,-0.325) N11(-0.975,-0.325) N12(-0.325,-0.325) N13(0.325,-0.325) N14(0.975,-0.325) N15(1.625,-0.325) N16(2.275,-0.325) N17(2.925,-0.325) N18(3.575,-0.325) N19(4.225,-0.325) N20(4.875,-0.325) N21(5.525,-0.325) N22(6.175,-0.325) N23(6.825,-0.325) N24(7.475,-0.325) P1(-7.475,-0.975) P2(-6.825,-0.975) P8(-2.925,-0.975) P10(-1.625,-0.975) P11(-0.975,-0.975) P12(-0.325,-0.975) P13(0.325,-0.975) P14(0.975,-0.975) P15(1.625,-0.975) P17(2.925,-0.975) P23(6.825,-0.975) P24(7.475,-0.975) R1(-7.475,-1.625) R2(-6.825,-1.625) R3(-6.175,-1.625) R4(-5.525,-1.625) R5(-4.875,-1.625) R6(-4.225,-1.625) R7(-3.575,-1.625) R8(-2.925,-1.625) R10(-1.625,-1.625) R11(-0.975,-1.625) R14(0.975,-1.625) R15(1.625,-1.625) R17(2.925,-1.625) R18(3.575,-1.625) R19(4.225,-1.625) R20(4.875,-1.625) R21(5.525,-1.625) R22(6.175,-1.625) R23(6.825,-1.625) T2(-6.825,-2.275) T3(-6.175,-2.275) T4(-5.525,-2.275) T5(-4.875,-2.275) T6(-4.225,-2.275) T7(-3.575,-2.275) T8(-2.925,-2.275) T9(-2.275,-2.275) T10(-1.625,-2.275) T11(-0.975,-2.275) T12(-0.325,-2.275) T13(0.325,-2.275) T14(0.975,-2.275) T15(1.625,-2.275) T16(2.275,-2.275) T17(2.925,-2.275) T18(3.575,-2.275) T19(4.225,-2.275) T20(4.875,-2.275) T21(5.525,-2.275) T22(6.175,-2.275) T23(6.825,-2.275) T24(7.475,-2.275) U1(-7.475,-2.925) U2(-6.825,-2.925) U8(-2.925,-2.925) U9(-2.275,-2.925) U10(-1.625,-2.925) U11(-0.975,-2.925) U12(-0.325,-2.925) U13(0.325,-2.925) U14(0.975,-2.925) U15(1.625,-2.925) U16(2.275,-2.925) U17(2.925,-2.925) U23(6.825,-2.925) U24(7.475,-2.925) V1(-7.475,-3.575) V2(-6.825,-3.575) V3(-6.175,-3.575) V4(-5.525,-3.575) V5(-4.875,-3.575) V6(-4.225,-3.575) V7(-3.575,-3.575) V9(-2.275,-3.575) V10(-1.625,-3.575) V12(-0.325,-3.575) V13(0.325,-3.575) V15(1.625,-3.575) V16(2.275,-3.575) V18(3.575,-3.575) V19(4.225,-3.575) V20(4.875,-3.575) V21(5.525,-3.575) V22(6.175,-3.575) V23(6.825,-3.575) W2(-6.825,-4.225) W3(-6.175,-4.225) W4(-5.525,-4.225) W6(-4.225,-4.225) W7(-3.575,-4.225) W9(-2.275,-4.225) W10(-1.625,-4.225) W12(-0.325,-4.225) W13(0.325,-4.225) W15(1.625,-4.225) W16(2.275,-4.225) W18(3.575,-4.225) W19(4.225,-4.225) W21(5.525,-4.225) W22(6.175,-4.225) W23(6.825,-4.225) W24(7.475,-4.225) Y1(-7.475,-4.875) Y2(-6.825,-4.875) Y3(-6.175,-4.875) Y7(-3.575,-4.875) Y9(-2.275,-4.875) Y10(-1.625,-4.875) Y12(-0.325,-4.875) Y13(0.325,-4.875) Y15(1.625,-4.875) Y16(2.275,-4.875) Y18(3.575,-4.875) Y22(6.175,-4.875) Y23(6.825,-4.875) Y24(7.475,-4.875)